# Altium schematic symbol library MCU_Microchip_ATmega.SchLib: 440 symbols (part 2 of 9)
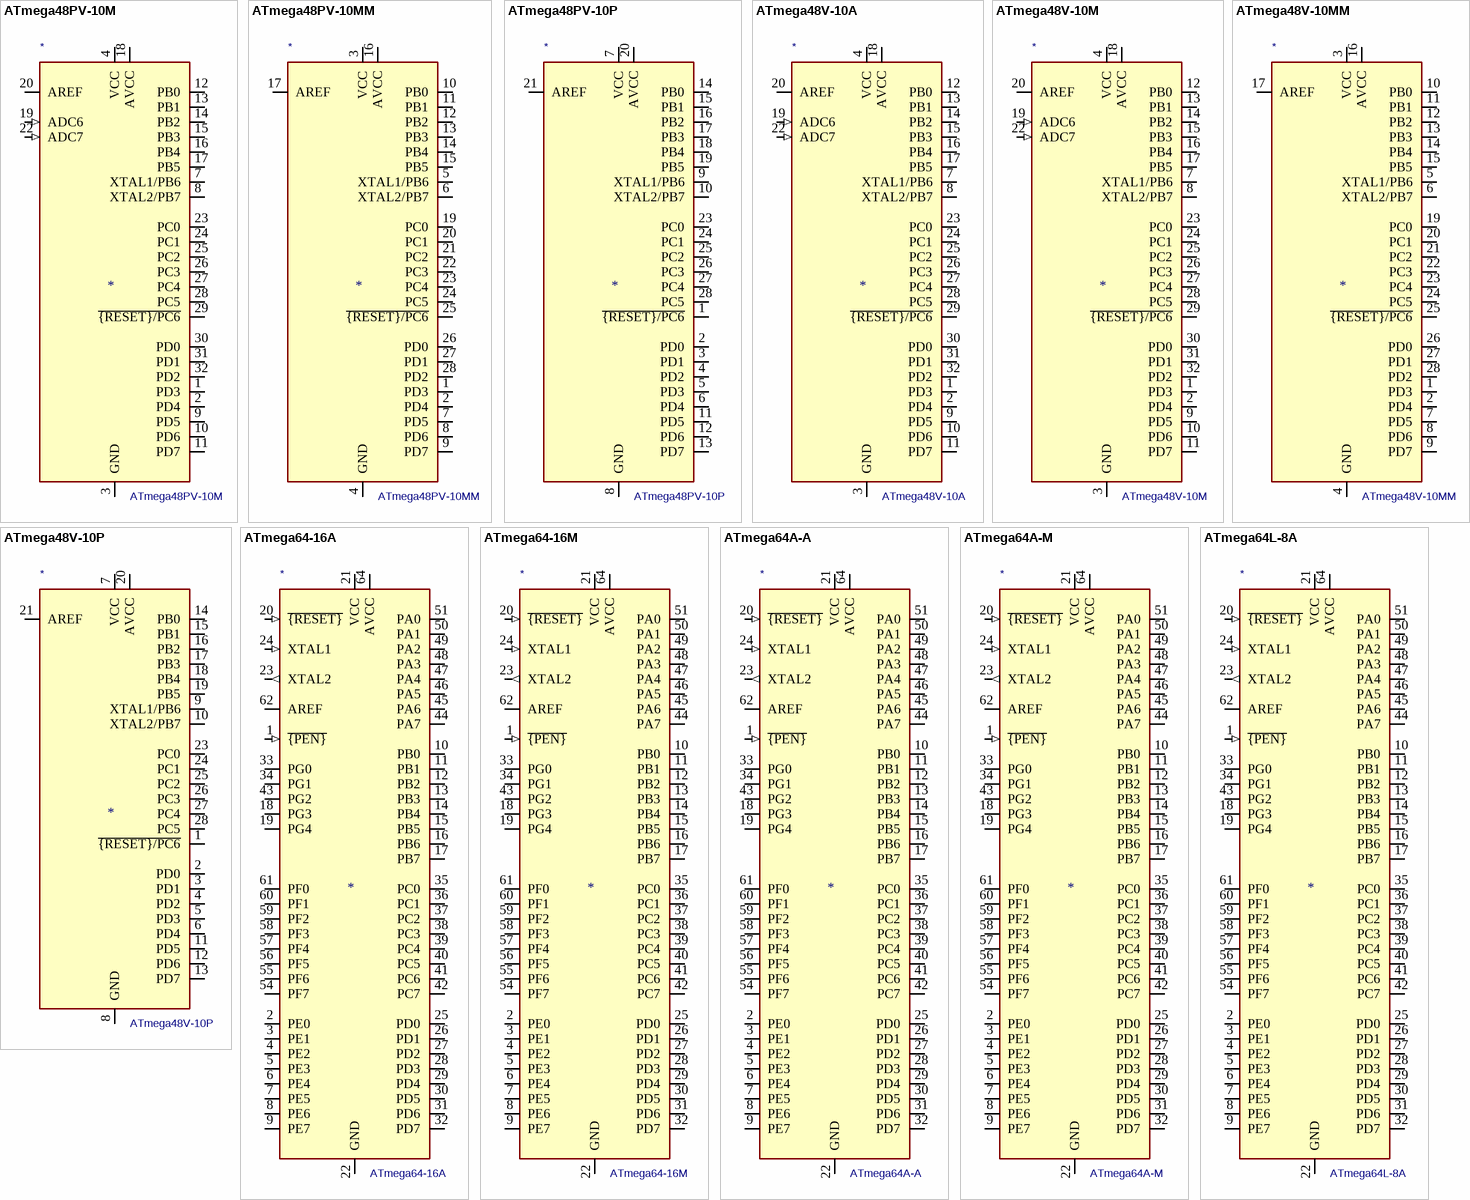
[diagram p41: symbols ATmega48PV-10M to ATmega64L-8A]

## ATmega48PV-10MM
designator *  value ATmega48PV-10MM
ki_keywords: AVR 8bit Microcontroller MegaAVR; ki_description: 10MHz, 4kB Flash, 512B SRAM, 256B EEPROM, QFN-28; ki_fp_filters: QFN*1EP*4x4mm*P0.45mm*; Footprint: Package_DFN_QFN:QFN-28-1EP_4x4mm_P0.45mm_EP2.4x2.4mm; Supplier: http://ww1.microchip.com/downloads/en/DeviceDoc/Atmel-8025-8-bit-AVR-Microcontroller-ATmega48P-88P-168P_Datasheet.pdf
footprint QFN-28-1EP_4x4mm_P0.45mm_EP2.4x2.4mm
pins: 1 PD3 (io), 2 PD4 (io), 3 VCC (power), 4 GND (power), 5 XTAL1/PB6 (io), 6 XTAL2/PB7 (io), 7 PD5 (io), 8 PD6 (io), 9 PD7 (io), 10 PB0 (io), 11 PB1 (io), 12 PB2 (io), 13 PB3 (io), 14 PB4 (io), 15 PB5 (io), 16 AVCC (power), 17 AREF, 18 GND hidden, 19 PC0 (io), 20 PC1 (io), 21 PC2 (io), 22 PC3 (io), 23 PC4 (io), 24 PC5 (io), 25 ~{{RESET}/PC6} (io), 26 PD0 (io), 27 PD1 (io), 28 PD2 (io), 29 GND hidden

## ATmega48PV-10P
designator *  value ATmega48PV-10P
ki_keywords: AVR 8bit Microcontroller MegaAVR; ki_description: 10MHz, 4kB Flash, 512B SRAM, 256B EEPROM, DIP-28; ki_fp_filters: DIP*W7.62mm*; Footprint: Package_DIP:DIP-28_W7.62mm; Supplier: http://ww1.microchip.com/downloads/en/DeviceDoc/Atmel-8025-8-bit-AVR-Microcontroller-ATmega48P-88P-168P_Datasheet.pdf
footprint DIP-28_W7.62mm
pins: 1 ~{{RESET}/PC6} (io), 2 PD0 (io), 3 PD1 (io), 4 PD2 (io), 5 PD3 (io), 6 PD4 (io), 7 VCC (power), 8 GND (power), 9 XTAL1/PB6 (io), 10 XTAL2/PB7 (io), 11 PD5 (io), 12 PD6 (io), 13 PD7 (io), 14 PB0 (io), 15 PB1 (io), 16 PB2 (io), 17 PB3 (io), 18 PB4 (io), 19 PB5 (io), 20 AVCC (power), 21 AREF, 22 GND hidden, 23 PC0 (io), 24 PC1 (io), 25 PC2 (io), 26 PC3 (io), 27 PC4 (io), 28 PC5 (io)

## ATmega48V-10A
designator *  value ATmega48V-10A
ki_keywords: AVR 8bit Microcontroller MegaAVR; ki_description: 10MHz, 4kB Flash, 512B SRAM, 256B EEPROM, TQFP-32; ki_fp_filters: TQFP*7x7mm*P0.8mm*; Footprint: Package_QFP:TQFP-32_7x7mm_P0.8mm; Supplier: http://ww1.microchip.com/downloads/en/DeviceDoc/Atmel-2545-8-bit-AVR-Microcontroller-ATmega48-88-168_Datasheet.pdf
footprint TQFP-32_7x7mm_P0.8mm
pins: 1 PD3 (io), 2 PD4 (io), 3 GND (power), 4 VCC (power), 5 GND hidden, 6 VCC hidden, 7 XTAL1/PB6 (io), 8 XTAL2/PB7 (io), 9 PD5 (io), 10 PD6 (io), 11 PD7 (io), 12 PB0 (io), 13 PB1 (io), 14 PB2 (io), 15 PB3 (io), 16 PB4 (io), 17 PB5 (io), 18 AVCC (power), 19 ADC6 (in), 20 AREF, 21 GND hidden, 22 ADC7 (in), 23 PC0 (io), 24 PC1 (io), 25 PC2 (io), 26 PC3 (io), 27 PC4 (io), 28 PC5 (io), 29 ~{{RESET}/PC6} (io), 30 PD0 (io), 31 PD1 (io), 32 PD2 (io)

## ATmega48V-10M
designator *  value ATmega48V-10M
ki_keywords: AVR 8bit Microcontroller MegaAVR; ki_description: 10MHz, 4kB Flash, 512B SRAM, 256B EEPROM, QFN-32; ki_fp_filters: QFN*1EP*5x5mm*P0.5mm*; Footprint: Package_DFN_QFN:QFN-32-1EP_5x5mm_P0.5mm_EP3.1x3.1mm; Supplier: http://ww1.microchip.com/downloads/en/DeviceDoc/Atmel-2545-8-bit-AVR-Microcontroller-ATmega48-88-168_Datasheet.pdf
footprint QFN-32-1EP_5x5mm_P0.5mm_EP3.1x3.1mm
pins: 1 PD3 (io), 2 PD4 (io), 3 GND (power), 4 VCC (power), 5 GND hidden, 6 VCC hidden, 7 XTAL1/PB6 (io), 8 XTAL2/PB7 (io), 9 PD5 (io), 10 PD6 (io), 11 PD7 (io), 12 PB0 (io), 13 PB1 (io), 14 PB2 (io), 15 PB3 (io), 16 PB4 (io), 17 PB5 (io), 18 AVCC (power), 19 ADC6 (in), 20 AREF, 21 GND hidden, 22 ADC7 (in), 23 PC0 (io), 24 PC1 (io), 25 PC2 (io), 26 PC3 (io), 27 PC4 (io), 28 PC5 (io), 29 ~{{RESET}/PC6} (io), 30 PD0 (io), 31 PD1 (io), 32 PD2 (io), 33 GND hidden

## ATmega48V-10MM
designator *  value ATmega48V-10MM
ki_keywords: AVR 8bit Microcontroller MegaAVR; ki_description: 10MHz, 4kB Flash, 512B SRAM, 256B EEPROM, QFN-28; ki_fp_filters: QFN*1EP*4x4mm*P0.45mm*; Footprint: Package_DFN_QFN:QFN-28-1EP_4x4mm_P0.45mm_EP2.4x2.4mm; Supplier: http://ww1.microchip.com/downloads/en/DeviceDoc/Atmel-2545-8-bit-AVR-Microcontroller-ATmega48-88-168_Datasheet.pdf
footprint QFN-28-1EP_4x4mm_P0.45mm_EP2.4x2.4mm
pins: 1 PD3 (io), 2 PD4 (io), 3 VCC (power), 4 GND (power), 5 XTAL1/PB6 (io), 6 XTAL2/PB7 (io), 7 PD5 (io), 8 PD6 (io), 9 PD7 (io), 10 PB0 (io), 11 PB1 (io), 12 PB2 (io), 13 PB3 (io), 14 PB4 (io), 15 PB5 (io), 16 AVCC (power), 17 AREF, 18 GND hidden, 19 PC0 (io), 20 PC1 (io), 21 PC2 (io), 22 PC3 (io), 23 PC4 (io), 24 PC5 (io), 25 ~{{RESET}/PC6} (io), 26 PD0 (io), 27 PD1 (io), 28 PD2 (io), 29 GND hidden

## ATmega48V-10P
designator *  value ATmega48V-10P
ki_keywords: AVR 8bit Microcontroller MegaAVR; ki_description: 10MHz, 4kB Flash, 512B SRAM, 256B EEPROM, DIP-28; ki_fp_filters: DIP*W7.62mm*; Footprint: Package_DIP:DIP-28_W7.62mm; Supplier: http://ww1.microchip.com/downloads/en/DeviceDoc/Atmel-2545-8-bit-AVR-Microcontroller-ATmega48-88-168_Datasheet.pdf
footprint DIP-28_W7.62mm
pins: 1 ~{{RESET}/PC6} (io), 2 PD0 (io), 3 PD1 (io), 4 PD2 (io), 5 PD3 (io), 6 PD4 (io), 7 VCC (power), 8 GND (power), 9 XTAL1/PB6 (io), 10 XTAL2/PB7 (io), 11 PD5 (io), 12 PD6 (io), 13 PD7 (io), 14 PB0 (io), 15 PB1 (io), 16 PB2 (io), 17 PB3 (io), 18 PB4 (io), 19 PB5 (io), 20 AVCC (power), 21 AREF, 22 GND hidden, 23 PC0 (io), 24 PC1 (io), 25 PC2 (io), 26 PC3 (io), 27 PC4 (io), 28 PC5 (io)

## ATmega64-16A
designator *  value ATmega64-16A
ki_keywords: AVR 8bit Microcontroller MegaAVR; ki_description: 16MHz, 64kB Flash, 4kB SRAM, 2kB EEPROM, TQFP-64; ki_fp_filters: TQFP*14x14mm*P0.8mm*; Footprint: Package_QFP:TQFP-64_14x14mm_P0.8mm; Supplier: http://ww1.microchip.com/downloads/en/DeviceDoc/atmel-2490-8-bit-avr-microcontroller-atmega64-l_datasheet.pdf
footprint TQFP-64_14x14mm_P0.8mm
pins: 1 ~{{PEN}} (in), 2 PE0 (io), 3 PE1 (io), 4 PE2 (io), 5 PE3 (io), 6 PE4 (io), 7 PE5 (io), 8 PE6 (io), 9 PE7 (io), 10 PB0 (io), 11 PB1 (io), 12 PB2 (io), 13 PB3 (io), 14 PB4 (io), 15 PB5 (io), 16 PB6 (io), 17 PB7 (io), 18 PG3 (io), 19 PG4 (io), 20 ~{{RESET}} (in), 21 VCC (power), 22 GND (power), 23 XTAL2 (out), 24 XTAL1 (in), 25 PD0 (io), 26 PD1 (io), 27 PD2 (io), 28 PD3 (io), 29 PD4 (io), 30 PD5 (io), 31 PD6 (io), 32 PD7 (io), 33 PG0 (io), 34 PG1 (io), 35 PC0 (io), 36 PC1 (io), 37 PC2 (io), 38 PC3 (io), 39 PC4 (io), 40 PC5 (io), 41 PC6 (io), 42 PC7 (io), 43 PG2 (io), 44 PA7 (io), 45 PA6 (io), 46 PA5 (io), 47 PA4 (io), 48 PA3 (io), 49 PA2 (io), 50 PA1 (io), 51 PA0 (io), 52 VCC hidden, 53 GND hidden, 54 PF7 (io), 55 PF6 (io), 56 PF5 (io), 57 PF4 (io), 58 PF3 (io), 59 PF2 (io), 60 PF1 (io), 61 PF0 (io), 62 AREF, 63 GND hidden, 64 AVCC (power)

## ATmega64-16M
designator *  value ATmega64-16M
ki_keywords: AVR 8bit Microcontroller MegaAVR; ki_description: 16MHz, 64kB Flash, 4kB SRAM, 2kB EEPROM, QFN-64; ki_fp_filters: QFN*1EP*9x9mm*P0.5mm*; Footprint: Package_DFN_QFN:QFN-64-1EP_9x9mm_P0.5mm_EP5.4x5.4mm; Supplier: http://ww1.microchip.com/downloads/en/DeviceDoc/atmel-2490-8-bit-avr-microcontroller-atmega64-l_datasheet.pdf
footprint QFN-64-1EP_9x9mm_P0.5mm_EP5.4x5.4mm
pins: 1 ~{{PEN}} (in), 2 PE0 (io), 3 PE1 (io), 4 PE2 (io), 5 PE3 (io), 6 PE4 (io), 7 PE5 (io), 8 PE6 (io), 9 PE7 (io), 10 PB0 (io), 11 PB1 (io), 12 PB2 (io), 13 PB3 (io), 14 PB4 (io), 15 PB5 (io), 16 PB6 (io), 17 PB7 (io), 18 PG3 (io), 19 PG4 (io), 20 ~{{RESET}} (in), 21 VCC (power), 22 GND (power), 23 XTAL2 (out), 24 XTAL1 (in), 25 PD0 (io), 26 PD1 (io), 27 PD2 (io), 28 PD3 (io), 29 PD4 (io), 30 PD5 (io), 31 PD6 (io), 32 PD7 (io), 33 PG0 (io), 34 PG1 (io), 35 PC0 (io), 36 PC1 (io), 37 PC2 (io), 38 PC3 (io), 39 PC4 (io), 40 PC5 (io), 41 PC6 (io), 42 PC7 (io), 43 PG2 (io), 44 PA7 (io), 45 PA6 (io), 46 PA5 (io), 47 PA4 (io), 48 PA3 (io), 49 PA2 (io), 50 PA1 (io), 51 PA0 (io), 52 VCC hidden, 53 GND hidden, 54 PF7 (io), 55 PF6 (io), 56 PF5 (io), 57 PF4 (io), 58 PF3 (io), 59 PF2 (io), 60 PF1 (io), 61 PF0 (io), 62 AREF, 63 GND hidden, 64 AVCC (power), 65 GND hidden

## ATmega64A-A
designator *  value ATmega64A-A
ki_keywords: AVR 8bit Microcontroller MegaAVR; ki_description: 16MHz, 64kB Flash, 4kB SRAM, 2kB EEPROM, TQFP-64; ki_fp_filters: TQFP*14x14mm*P0.8mm*; Footprint: Package_QFP:TQFP-64_14x14mm_P0.8mm; Supplier: http://ww1.microchip.com/downloads/en/DeviceDoc/atmel-8160-8-bit-avr-microcontroller-atmega64a-datasheet.pdf
footprint TQFP-64_14x14mm_P0.8mm
pins: 1 ~{{PEN}} (in), 2 PE0 (io), 3 PE1 (io), 4 PE2 (io), 5 PE3 (io), 6 PE4 (io), 7 PE5 (io), 8 PE6 (io), 9 PE7 (io), 10 PB0 (io), 11 PB1 (io), 12 PB2 (io), 13 PB3 (io), 14 PB4 (io), 15 PB5 (io), 16 PB6 (io), 17 PB7 (io), 18 PG3 (io), 19 PG4 (io), 20 ~{{RESET}} (in), 21 VCC (power), 22 GND (power), 23 XTAL2 (out), 24 XTAL1 (in), 25 PD0 (io), 26 PD1 (io), 27 PD2 (io), 28 PD3 (io), 29 PD4 (io), 30 PD5 (io), 31 PD6 (io), 32 PD7 (io), 33 PG0 (io), 34 PG1 (io), 35 PC0 (io), 36 PC1 (io), 37 PC2 (io), 38 PC3 (io), 39 PC4 (io), 40 PC5 (io), 41 PC6 (io), 42 PC7 (io), 43 PG2 (io), 44 PA7 (io), 45 PA6 (io), 46 PA5 (io), 47 PA4 (io), 48 PA3 (io), 49 PA2 (io), 50 PA1 (io), 51 PA0 (io), 52 VCC hidden, 53 GND hidden, 54 PF7 (io), 55 PF6 (io), 56 PF5 (io), 57 PF4 (io), 58 PF3 (io), 59 PF2 (io), 60 PF1 (io), 61 PF0 (io), 62 AREF, 63 GND hidden, 64 AVCC (power)

## ATmega64A-M
designator *  value ATmega64A-M
ki_keywords: AVR 8bit Microcontroller MegaAVR; ki_description: 16MHz, 64kB Flash, 4kB SRAM, 2kB EEPROM, QFN-64; ki_fp_filters: QFN*1EP*9x9mm*P0.5mm*; Footprint: Package_DFN_QFN:QFN-64-1EP_9x9mm_P0.5mm_EP5.4x5.4mm; Supplier: http://ww1.microchip.com/downloads/en/DeviceDoc/atmel-8160-8-bit-avr-microcontroller-atmega64a-datasheet.pdf
footprint QFN-64-1EP_9x9mm_P0.5mm_EP5.4x5.4mm
pins: 1 ~{{PEN}} (in), 2 PE0 (io), 3 PE1 (io), 4 PE2 (io), 5 PE3 (io), 6 PE4 (io), 7 PE5 (io), 8 PE6 (io), 9 PE7 (io), 10 PB0 (io), 11 PB1 (io), 12 PB2 (io), 13 PB3 (io), 14 PB4 (io), 15 PB5 (io), 16 PB6 (io), 17 PB7 (io), 18 PG3 (io), 19 PG4 (io), 20 ~{{RESET}} (in), 21 VCC (power), 22 GND (power), 23 XTAL2 (out), 24 XTAL1 (in), 25 PD0 (io), 26 PD1 (io), 27 PD2 (io), 28 PD3 (io), 29 PD4 (io), 30 PD5 (io), 31 PD6 (io), 32 PD7 (io), 33 PG0 (io), 34 PG1 (io), 35 PC0 (io), 36 PC1 (io), 37 PC2 (io), 38 PC3 (io), 39 PC4 (io), 40 PC5 (io), 41 PC6 (io), 42 PC7 (io), 43 PG2 (io), 44 PA7 (io), 45 PA6 (io), 46 PA5 (io), 47 PA4 (io), 48 PA3 (io), 49 PA2 (io), 50 PA1 (io), 51 PA0 (io), 52 VCC hidden, 53 GND hidden, 54 PF7 (io), 55 PF6 (io), 56 PF5 (io), 57 PF4 (io), 58 PF3 (io), 59 PF2 (io), 60 PF1 (io), 61 PF0 (io), 62 AREF, 63 GND hidden, 64 AVCC (power), 65 GND hidden

## ATmega64L-8A
designator *  value ATmega64L-8A
ki_keywords: AVR 8bit Microcontroller MegaAVR; ki_description: 8MHz, 64kB Flash, 4kB SRAM, 2kB EEPROM, TQFP-64; ki_fp_filters: TQFP*14x14mm*P0.8mm*; Footprint: Package_QFP:TQFP-64_14x14mm_P0.8mm; Supplier: http://ww1.microchip.com/downloads/en/DeviceDoc/atmel-2490-8-bit-avr-microcontroller-atmega64-l_datasheet.pdf
footprint TQFP-64_14x14mm_P0.8mm
pins: 1 ~{{PEN}} (in), 2 PE0 (io), 3 PE1 (io), 4 PE2 (io), 5 PE3 (io), 6 PE4 (io), 7 PE5 (io), 8 PE6 (io), 9 PE7 (io), 10 PB0 (io), 11 PB1 (io), 12 PB2 (io), 13 PB3 (io), 14 PB4 (io), 15 PB5 (io), 16 PB6 (io), 17 PB7 (io), 18 PG3 (io), 19 PG4 (io), 20 ~{{RESET}} (in), 21 VCC (power), 22 GND (power), 23 XTAL2 (out), 24 XTAL1 (in), 25 PD0 (io), 26 PD1 (io), 27 PD2 (io), 28 PD3 (io), 29 PD4 (io), 30 PD5 (io), 31 PD6 (io), 32 PD7 (io), 33 PG0 (io), 34 PG1 (io), 35 PC0 (io), 36 PC1 (io), 37 PC2 (io), 38 PC3 (io), 39 PC4 (io), 40 PC5 (io), 41 PC6 (io), 42 PC7 (io), 43 PG2 (io), 44 PA7 (io), 45 PA6 (io), 46 PA5 (io), 47 PA4 (io), 48 PA3 (io), 49 PA2 (io), 50 PA1 (io), 51 PA0 (io), 52 VCC hidden, 53 GND hidden, 54 PF7 (io), 55 PF6 (io), 56 PF5 (io), 57 PF4 (io), 58 PF3 (io), 59 PF2 (io), 60 PF1 (io), 61 PF0 (io), 62 AREF, 63 GND hidden, 64 AVCC (power)

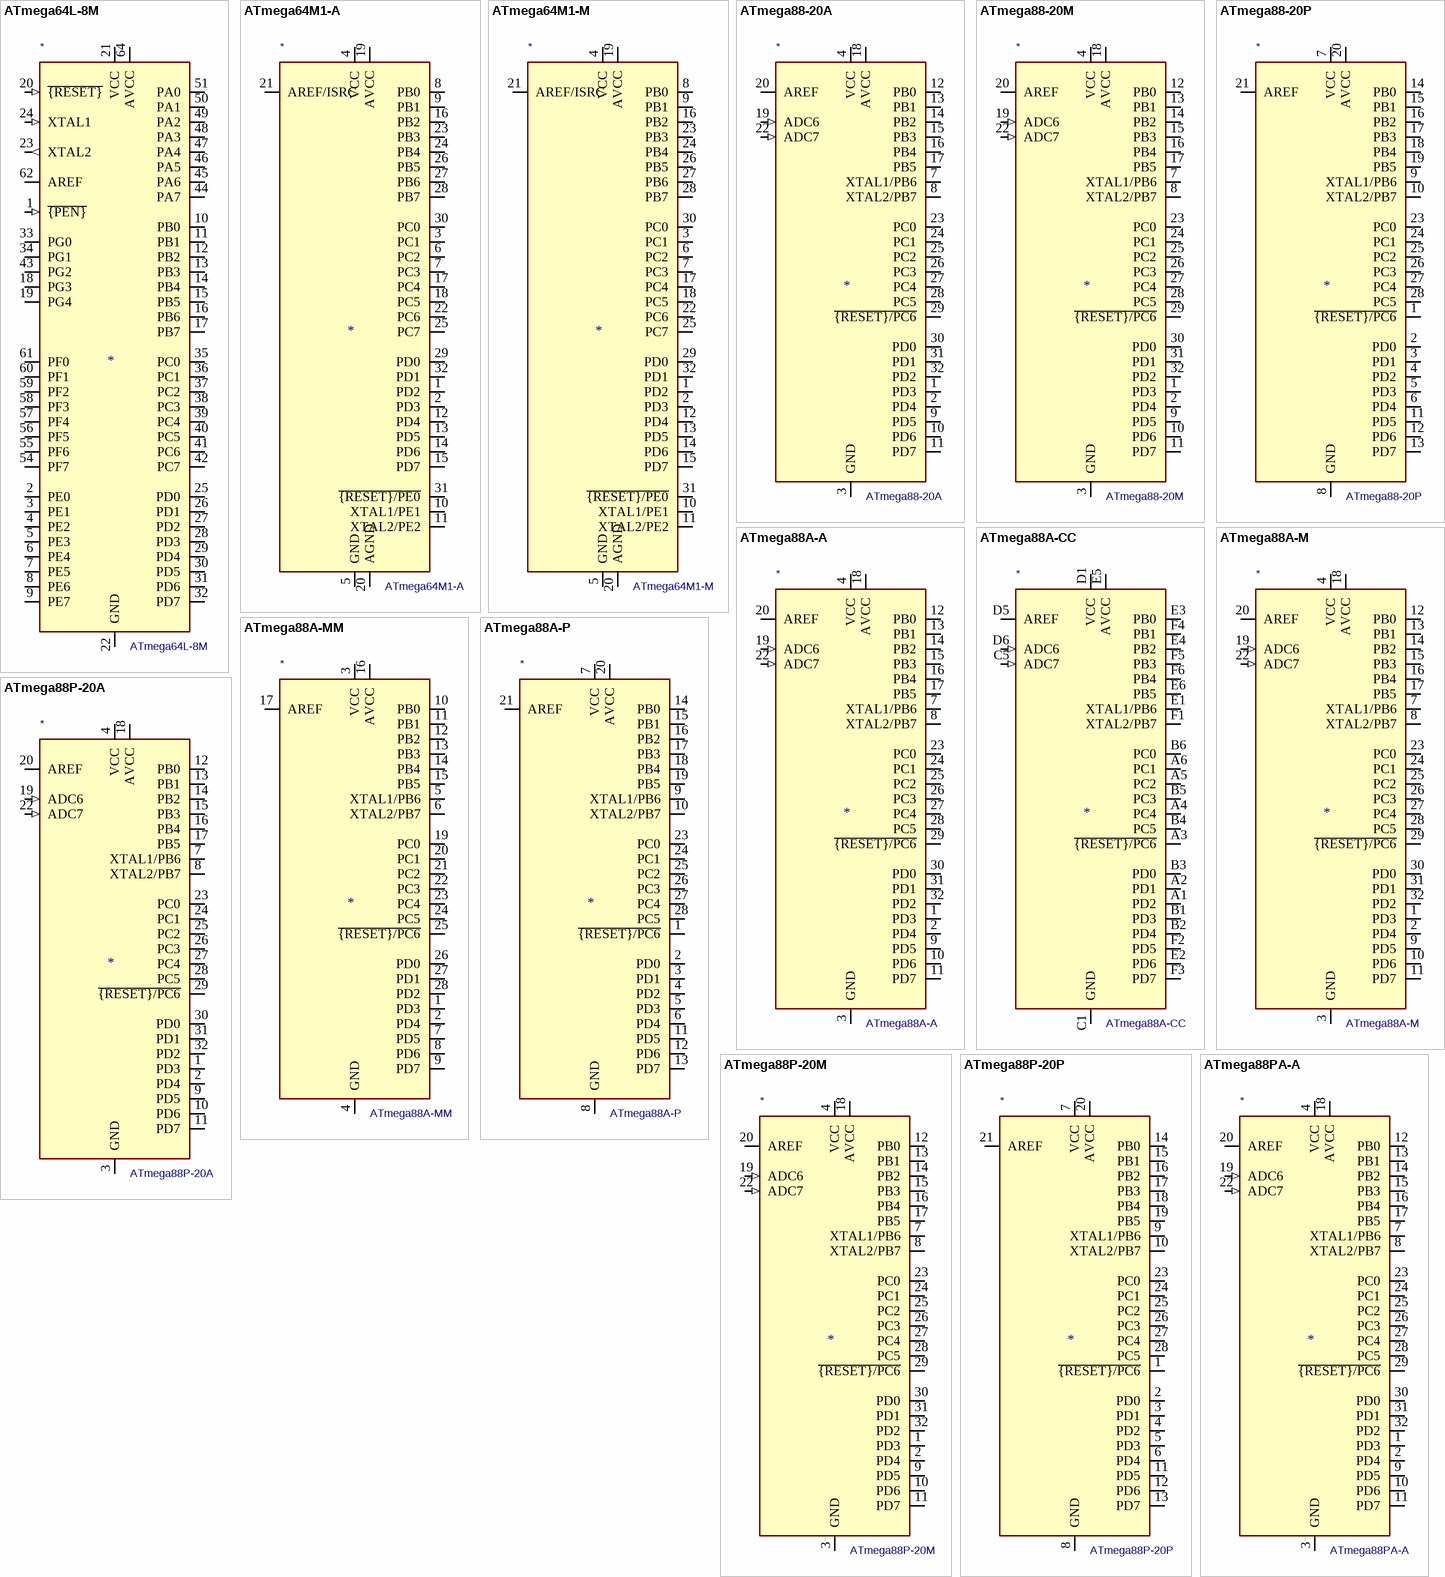
[diagram p6: symbols ATmega64L-8M to ATmega88PA-A]

## ATmega64L-8M
designator *  value ATmega64L-8M
ki_keywords: AVR 8bit Microcontroller MegaAVR; ki_description: 8MHz, 64kB Flash, 4kB SRAM, 2kB EEPROM, QFN-64; ki_fp_filters: QFN*1EP*9x9mm*P0.5mm*; Footprint: Package_DFN_QFN:QFN-64-1EP_9x9mm_P0.5mm_EP5.4x5.4mm; Supplier: http://ww1.microchip.com/downloads/en/DeviceDoc/atmel-2490-8-bit-avr-microcontroller-atmega64-l_datasheet.pdf
footprint QFN-64-1EP_9x9mm_P0.5mm_EP5.4x5.4mm
pins: 1 ~{{PEN}} (in), 2 PE0 (io), 3 PE1 (io), 4 PE2 (io), 5 PE3 (io), 6 PE4 (io), 7 PE5 (io), 8 PE6 (io), 9 PE7 (io), 10 PB0 (io), 11 PB1 (io), 12 PB2 (io), 13 PB3 (io), 14 PB4 (io), 15 PB5 (io), 16 PB6 (io), 17 PB7 (io), 18 PG3 (io), 19 PG4 (io), 20 ~{{RESET}} (in), 21 VCC (power), 22 GND (power), 23 XTAL2 (out), 24 XTAL1 (in), 25 PD0 (io), 26 PD1 (io), 27 PD2 (io), 28 PD3 (io), 29 PD4 (io), 30 PD5 (io), 31 PD6 (io), 32 PD7 (io), 33 PG0 (io), 34 PG1 (io), 35 PC0 (io), 36 PC1 (io), 37 PC2 (io), 38 PC3 (io), 39 PC4 (io), 40 PC5 (io), 41 PC6 (io), 42 PC7 (io), 43 PG2 (io), 44 PA7 (io), 45 PA6 (io), 46 PA5 (io), 47 PA4 (io), 48 PA3 (io), 49 PA2 (io), 50 PA1 (io), 51 PA0 (io), 52 VCC hidden, 53 GND hidden, 54 PF7 (io), 55 PF6 (io), 56 PF5 (io), 57 PF4 (io), 58 PF3 (io), 59 PF2 (io), 60 PF1 (io), 61 PF0 (io), 62 AREF, 63 GND hidden, 64 AVCC (power), 65 GND hidden

## ATmega64M1-A
designator *  value ATmega64M1-A
ki_keywords: AVR 8bit Microcontroller MegaAVR; ki_description: 16MHz, 64kB Flash, 4kB SRAM, 2kB EEPROM, CAN, TQFP-32; ki_fp_filters: TQFP*7x7mm*P0.8mm*; Footprint: Package_QFP:TQFP-32_7x7mm_P0.8mm; Supplier: http://ww1.microchip.com/downloads/en/DeviceDoc/Atmel-8209-8-bit%20AVR%20ATmega16M1-32M1-64M1_Datasheet.pdf
footprint TQFP-32_7x7mm_P0.8mm
pins: 1 PD2 (io), 2 PD3 (io), 3 PC1 (io), 4 VCC (power), 5 GND (power), 6 PC2 (io), 7 PC3 (io), 8 PB0 (io), 9 PB1 (io), 10 XTAL1/PE1 (io), 11 XTAL2/PE2 (io), 12 PD4 (io), 13 PD5 (io), 14 PD6 (io), 15 PD7 (io), 16 PB2 (io), 17 PC4 (io), 18 PC5 (io), 19 AVCC (power), 20 AGND (power), 21 AREF/ISRC, 22 PC6 (io), 23 PB3 (io), 24 PB4 (io), 25 PC7 (io), 26 PB5 (io), 27 PB6 (io), 28 PB7 (io), 29 PD0 (io), 30 PC0 (io), 31 ~{{RESET}/PE0} (io), 32 PD1 (io)

## ATmega64M1-M
designator *  value ATmega64M1-M
ki_keywords: AVR 8bit Microcontroller MegaAVR; ki_description: 16MHz, 64kB Flash, 4kB SRAM, 2kB EEPROM, CAN, QFN-32; ki_fp_filters: QFN*1EP*7x7mm*P0.65mm*; Footprint: Package_DFN_QFN:QFN-32-1EP_7x7mm_P0.65mm_EP4.65x4.65mm; Supplier: http://ww1.microchip.com/downloads/en/DeviceDoc/Atmel-8209-8-bit%20AVR%20ATmega16M1-32M1-64M1_Datasheet.pdf
footprint QFN-32-1EP_7x7mm_P0.65mm_EP4.65x4.65mm
pins: 1 PD2 (io), 2 PD3 (io), 3 PC1 (io), 4 VCC (power), 5 GND (power), 6 PC2 (io), 7 PC3 (io), 8 PB0 (io), 9 PB1 (io), 10 XTAL1/PE1 (io), 11 XTAL2/PE2 (io), 12 PD4 (io), 13 PD5 (io), 14 PD6 (io), 15 PD7 (io), 16 PB2 (io), 17 PC4 (io), 18 PC5 (io), 19 AVCC (power), 20 AGND (power), 21 AREF/ISRC, 22 PC6 (io), 23 PB3 (io), 24 PB4 (io), 25 PC7 (io), 26 PB5 (io), 27 PB6 (io), 28 PB7 (io), 29 PD0 (io), 30 PC0 (io), 31 ~{{RESET}/PE0} (io), 32 PD1 (io), 33 GND hidden

## ATmega88-20A
designator *  value ATmega88-20A
ki_keywords: AVR 8bit Microcontroller MegaAVR; ki_description: 20MHz, 8kB Flash, 1kB SRAM, 512B EEPROM, TQFP-32; ki_fp_filters: TQFP*7x7mm*P0.8mm*; Footprint: Package_QFP:TQFP-32_7x7mm_P0.8mm; Supplier: http://ww1.microchip.com/downloads/en/DeviceDoc/Atmel-2545-8-bit-AVR-Microcontroller-ATmega48-88-168_Datasheet.pdf
footprint TQFP-32_7x7mm_P0.8mm
pins: 1 PD3 (io), 2 PD4 (io), 3 GND (power), 4 VCC (power), 5 GND hidden, 6 VCC hidden, 7 XTAL1/PB6 (io), 8 XTAL2/PB7 (io), 9 PD5 (io), 10 PD6 (io), 11 PD7 (io), 12 PB0 (io), 13 PB1 (io), 14 PB2 (io), 15 PB3 (io), 16 PB4 (io), 17 PB5 (io), 18 AVCC (power), 19 ADC6 (in), 20 AREF, 21 GND hidden, 22 ADC7 (in), 23 PC0 (io), 24 PC1 (io), 25 PC2 (io), 26 PC3 (io), 27 PC4 (io), 28 PC5 (io), 29 ~{{RESET}/PC6} (io), 30 PD0 (io), 31 PD1 (io), 32 PD2 (io)

## ATmega88-20M
designator *  value ATmega88-20M
ki_keywords: AVR 8bit Microcontroller MegaAVR; ki_description: 20MHz, 8kB Flash, 1kB SRAM, 512B EEPROM, QFN-32; ki_fp_filters: QFN*1EP*5x5mm*P0.5mm*; Footprint: Package_DFN_QFN:QFN-32-1EP_5x5mm_P0.5mm_EP3.1x3.1mm; Supplier: http://ww1.microchip.com/downloads/en/DeviceDoc/Atmel-2545-8-bit-AVR-Microcontroller-ATmega48-88-168_Datasheet.pdf
footprint QFN-32-1EP_5x5mm_P0.5mm_EP3.1x3.1mm
pins: 1 PD3 (io), 2 PD4 (io), 3 GND (power), 4 VCC (power), 5 GND hidden, 6 VCC hidden, 7 XTAL1/PB6 (io), 8 XTAL2/PB7 (io), 9 PD5 (io), 10 PD6 (io), 11 PD7 (io), 12 PB0 (io), 13 PB1 (io), 14 PB2 (io), 15 PB3 (io), 16 PB4 (io), 17 PB5 (io), 18 AVCC (power), 19 ADC6 (in), 20 AREF, 21 GND hidden, 22 ADC7 (in), 23 PC0 (io), 24 PC1 (io), 25 PC2 (io), 26 PC3 (io), 27 PC4 (io), 28 PC5 (io), 29 ~{{RESET}/PC6} (io), 30 PD0 (io), 31 PD1 (io), 32 PD2 (io), 33 GND hidden

## ATmega88-20P
designator *  value ATmega88-20P
ki_keywords: AVR 8bit Microcontroller MegaAVR; ki_description: 20MHz, 8kB Flash, 1kB SRAM, 512B EEPROM, DIP-28; ki_fp_filters: DIP*W7.62mm*; Footprint: Package_DIP:DIP-28_W7.62mm; Supplier: http://ww1.microchip.com/downloads/en/DeviceDoc/Atmel-2545-8-bit-AVR-Microcontroller-ATmega48-88-168_Datasheet.pdf
footprint DIP-28_W7.62mm
pins: 1 ~{{RESET}/PC6} (io), 2 PD0 (io), 3 PD1 (io), 4 PD2 (io), 5 PD3 (io), 6 PD4 (io), 7 VCC (power), 8 GND (power), 9 XTAL1/PB6 (io), 10 XTAL2/PB7 (io), 11 PD5 (io), 12 PD6 (io), 13 PD7 (io), 14 PB0 (io), 15 PB1 (io), 16 PB2 (io), 17 PB3 (io), 18 PB4 (io), 19 PB5 (io), 20 AVCC (power), 21 AREF, 22 GND hidden, 23 PC0 (io), 24 PC1 (io), 25 PC2 (io), 26 PC3 (io), 27 PC4 (io), 28 PC5 (io)

## ATmega88A-A
designator *  value ATmega88A-A
ki_keywords: AVR 8bit Microcontroller MegaAVR; ki_description: 20MHz, 8kB Flash, 1kB SRAM, 512B EEPROM, TQFP-32; ki_fp_filters: TQFP*7x7mm*P0.8mm*; Footprint: Package_QFP:TQFP-32_7x7mm_P0.8mm; Supplier: http://ww1.microchip.com/downloads/en/DeviceDoc/ATmega48A_88A_168A-Data-Sheet-40002007A.pdf
footprint TQFP-32_7x7mm_P0.8mm
pins: 1 PD3 (io), 2 PD4 (io), 3 GND (power), 4 VCC (power), 5 GND hidden, 6 VCC hidden, 7 XTAL1/PB6 (io), 8 XTAL2/PB7 (io), 9 PD5 (io), 10 PD6 (io), 11 PD7 (io), 12 PB0 (io), 13 PB1 (io), 14 PB2 (io), 15 PB3 (io), 16 PB4 (io), 17 PB5 (io), 18 AVCC (power), 19 ADC6 (in), 20 AREF, 21 GND hidden, 22 ADC7 (in), 23 PC0 (io), 24 PC1 (io), 25 PC2 (io), 26 PC3 (io), 27 PC4 (io), 28 PC5 (io), 29 ~{{RESET}/PC6} (io), 30 PD0 (io), 31 PD1 (io), 32 PD2 (io)

## ATmega88A-CC
designator *  value ATmega88A-CC
ki_keywords: AVR 8bit Microcontroller MegaAVR; ki_description: 20MHz, 8kB Flash, 1kB SRAM, 512B EEPROM, UFBGA-32; ki_fp_filters: UFBGA*4.0x4.0mm*Layout6x6*P0.5mm*; Footprint: Package_BGA:UFBGA-32_4.0x4.0mm_Layout6x6_P0.5mm; Supplier: http://ww1.microchip.com/downloads/en/DeviceDoc/ATmega48A_88A_168A-Data-Sheet-40002007A.pdf
footprint UFBGA-32_4.0x4.0mm_Layout6x6_P0.5mm
pins: A1 PD2 (io), A2 PD1 (io), A3 ~{{RESET}/PC6} (io), A4 PC4 (io), A5 PC2 (io), A6 PC1 (io), B1 PD3 (io), B2 PD4 (io), B3 PD0 (io), B4 PC5 (io), B5 PC3 (io), B6 PC0 (io), C1 GND (power), C2 GND hidden, C5 ADC7 (in), C6 GND hidden, D1 VCC (power), D2 VCC hidden, D5 AREF, D6 ADC6 (in), E1 XTAL1/PB6 (io), E2 PD6 (io), E3 PB0 (io), E4 PB2 (io), E5 AVCC (power), E6 PB5 (io), F1 XTAL2/PB7 (io), F2 PD5 (io), F3 PD7 (io), F4 PB1 (io), F5 PB3 (io), F6 PB4 (io)

## ATmega88A-M
designator *  value ATmega88A-M
ki_keywords: AVR 8bit Microcontroller MegaAVR; ki_description: 20MHz, 8kB Flash, 1kB SRAM, 512B EEPROM, QFN-32; ki_fp_filters: QFN*1EP*5x5mm*P0.5mm*; Footprint: Package_DFN_QFN:QFN-32-1EP_5x5mm_P0.5mm_EP3.1x3.1mm; Supplier: http://ww1.microchip.com/downloads/en/DeviceDoc/ATmega48A_88A_168A-Data-Sheet-40002007A.pdf
footprint QFN-32-1EP_5x5mm_P0.5mm_EP3.1x3.1mm
pins: 1 PD3 (io), 2 PD4 (io), 3 GND (power), 4 VCC (power), 5 GND hidden, 6 VCC hidden, 7 XTAL1/PB6 (io), 8 XTAL2/PB7 (io), 9 PD5 (io), 10 PD6 (io), 11 PD7 (io), 12 PB0 (io), 13 PB1 (io), 14 PB2 (io), 15 PB3 (io), 16 PB4 (io), 17 PB5 (io), 18 AVCC (power), 19 ADC6 (in), 20 AREF, 21 GND hidden, 22 ADC7 (in), 23 PC0 (io), 24 PC1 (io), 25 PC2 (io), 26 PC3 (io), 27 PC4 (io), 28 PC5 (io), 29 ~{{RESET}/PC6} (io), 30 PD0 (io), 31 PD1 (io), 32 PD2 (io), 33 GND hidden

## ATmega88A-MM
designator *  value ATmega88A-MM
ki_keywords: AVR 8bit Microcontroller MegaAVR; ki_description: 20MHz, 8kB Flash, 1kB SRAM, 512B EEPROM, QFN-28; ki_fp_filters: QFN*1EP*4x4mm*P0.45mm*; Footprint: Package_DFN_QFN:QFN-28-1EP_4x4mm_P0.45mm_EP2.4x2.4mm; Supplier: http://ww1.microchip.com/downloads/en/DeviceDoc/ATmega48A_88A_168A-Data-Sheet-40002007A.pdf
footprint QFN-28-1EP_4x4mm_P0.45mm_EP2.4x2.4mm
pins: 1 PD3 (io), 2 PD4 (io), 3 VCC (power), 4 GND (power), 5 XTAL1/PB6 (io), 6 XTAL2/PB7 (io), 7 PD5 (io), 8 PD6 (io), 9 PD7 (io), 10 PB0 (io), 11 PB1 (io), 12 PB2 (io), 13 PB3 (io), 14 PB4 (io), 15 PB5 (io), 16 AVCC (power), 17 AREF, 18 GND hidden, 19 PC0 (io), 20 PC1 (io), 21 PC2 (io), 22 PC3 (io), 23 PC4 (io), 24 PC5 (io), 25 ~{{RESET}/PC6} (io), 26 PD0 (io), 27 PD1 (io), 28 PD2 (io), 29 GND hidden

## ATmega88A-P
designator *  value ATmega88A-P
ki_keywords: AVR 8bit Microcontroller MegaAVR; ki_description: 20MHz, 8kB Flash, 1kB SRAM, 512B EEPROM, DIP-28; ki_fp_filters: DIP*W7.62mm*; Footprint: Package_DIP:DIP-28_W7.62mm; Supplier: http://ww1.microchip.com/downloads/en/DeviceDoc/ATmega48A_88A_168A-Data-Sheet-40002007A.pdf
footprint DIP-28_W7.62mm
pins: 1 ~{{RESET}/PC6} (io), 2 PD0 (io), 3 PD1 (io), 4 PD2 (io), 5 PD3 (io), 6 PD4 (io), 7 VCC (power), 8 GND (power), 9 XTAL1/PB6 (io), 10 XTAL2/PB7 (io), 11 PD5 (io), 12 PD6 (io), 13 PD7 (io), 14 PB0 (io), 15 PB1 (io), 16 PB2 (io), 17 PB3 (io), 18 PB4 (io), 19 PB5 (io), 20 AVCC (power), 21 AREF, 22 GND hidden, 23 PC0 (io), 24 PC1 (io), 25 PC2 (io), 26 PC3 (io), 27 PC4 (io), 28 PC5 (io)

## ATmega88P-20A
designator *  value ATmega88P-20A
ki_keywords: AVR 8bit Microcontroller MegaAVR; ki_description: 20MHz, 8kB Flash, 1kB SRAM, 512B EEPROM, TQFP-32; ki_fp_filters: TQFP*7x7mm*P0.8mm*; Footprint: Package_QFP:TQFP-32_7x7mm_P0.8mm; Supplier: http://ww1.microchip.com/downloads/en/DeviceDoc/Atmel-8025-8-bit-AVR-Microcontroller-ATmega48P-88P-168P_Datasheet.pdf
footprint TQFP-32_7x7mm_P0.8mm
pins: 1 PD3 (io), 2 PD4 (io), 3 GND (power), 4 VCC (power), 5 GND hidden, 6 VCC hidden, 7 XTAL1/PB6 (io), 8 XTAL2/PB7 (io), 9 PD5 (io), 10 PD6 (io), 11 PD7 (io), 12 PB0 (io), 13 PB1 (io), 14 PB2 (io), 15 PB3 (io), 16 PB4 (io), 17 PB5 (io), 18 AVCC (power), 19 ADC6 (in), 20 AREF, 21 GND hidden, 22 ADC7 (in), 23 PC0 (io), 24 PC1 (io), 25 PC2 (io), 26 PC3 (io), 27 PC4 (io), 28 PC5 (io), 29 ~{{RESET}/PC6} (io), 30 PD0 (io), 31 PD1 (io), 32 PD2 (io)

## ATmega88P-20M
designator *  value ATmega88P-20M
ki_keywords: AVR 8bit Microcontroller MegaAVR; ki_description: 20MHz, 8kB Flash, 1kB SRAM, 512B EEPROM, QFN-32; ki_fp_filters: QFN*1EP*5x5mm*P0.5mm*; Footprint: Package_DFN_QFN:QFN-32-1EP_5x5mm_P0.5mm_EP3.1x3.1mm; Supplier: http://ww1.microchip.com/downloads/en/DeviceDoc/Atmel-8025-8-bit-AVR-Microcontroller-ATmega48P-88P-168P_Datasheet.pdf
footprint QFN-32-1EP_5x5mm_P0.5mm_EP3.1x3.1mm
pins: 1 PD3 (io), 2 PD4 (io), 3 GND (power), 4 VCC (power), 5 GND hidden, 6 VCC hidden, 7 XTAL1/PB6 (io), 8 XTAL2/PB7 (io), 9 PD5 (io), 10 PD6 (io), 11 PD7 (io), 12 PB0 (io), 13 PB1 (io), 14 PB2 (io), 15 PB3 (io), 16 PB4 (io), 17 PB5 (io), 18 AVCC (power), 19 ADC6 (in), 20 AREF, 21 GND hidden, 22 ADC7 (in), 23 PC0 (io), 24 PC1 (io), 25 PC2 (io), 26 PC3 (io), 27 PC4 (io), 28 PC5 (io), 29 ~{{RESET}/PC6} (io), 30 PD0 (io), 31 PD1 (io), 32 PD2 (io), 33 GND hidden

## ATmega88P-20P
designator *  value ATmega88P-20P
ki_keywords: AVR 8bit Microcontroller MegaAVR; ki_description: 20MHz, 8kB Flash, 1kB SRAM, 512B EEPROM, DIP-28; ki_fp_filters: DIP*W7.62mm*; Footprint: Package_DIP:DIP-28_W7.62mm; Supplier: http://ww1.microchip.com/downloads/en/DeviceDoc/Atmel-8025-8-bit-AVR-Microcontroller-ATmega48P-88P-168P_Datasheet.pdf
footprint DIP-28_W7.62mm
pins: 1 ~{{RESET}/PC6} (io), 2 PD0 (io), 3 PD1 (io), 4 PD2 (io), 5 PD3 (io), 6 PD4 (io), 7 VCC (power), 8 GND (power), 9 XTAL1/PB6 (io), 10 XTAL2/PB7 (io), 11 PD5 (io), 12 PD6 (io), 13 PD7 (io), 14 PB0 (io), 15 PB1 (io), 16 PB2 (io), 17 PB3 (io), 18 PB4 (io), 19 PB5 (io), 20 AVCC (power), 21 AREF, 22 GND hidden, 23 PC0 (io), 24 PC1 (io), 25 PC2 (io), 26 PC3 (io), 27 PC4 (io), 28 PC5 (io)

## ATmega88PA-A
designator *  value ATmega88PA-A
ki_keywords: AVR 8bit Microcontroller MegaAVR PicoPower; ki_description: 20MHz, 8kB Flash, 1kB SRAM, 512B EEPROM, TQFP-32; ki_fp_filters: TQFP*7x7mm*P0.8mm*; Footprint: Package_QFP:TQFP-32_7x7mm_P0.8mm; Supplier: http://ww1.microchip.com/downloads/en/DeviceDoc/ATmega48PA_88PA_168PA-Data-Sheet-40002011A.pdf
footprint TQFP-32_7x7mm_P0.8mm
pins: 1 PD3 (io), 2 PD4 (io), 3 GND (power), 4 VCC (power), 5 GND hidden, 6 VCC hidden, 7 XTAL1/PB6 (io), 8 XTAL2/PB7 (io), 9 PD5 (io), 10 PD6 (io), 11 PD7 (io), 12 PB0 (io), 13 PB1 (io), 14 PB2 (io), 15 PB3 (io), 16 PB4 (io), 17 PB5 (io), 18 AVCC (power), 19 ADC6 (in), 20 AREF, 21 GND hidden, 22 ADC7 (in), 23 PC0 (io), 24 PC1 (io), 25 PC2 (io), 26 PC3 (io), 27 PC4 (io), 28 PC5 (io), 29 ~{{RESET}/PC6} (io), 30 PD0 (io), 31 PD1 (io), 32 PD2 (io)

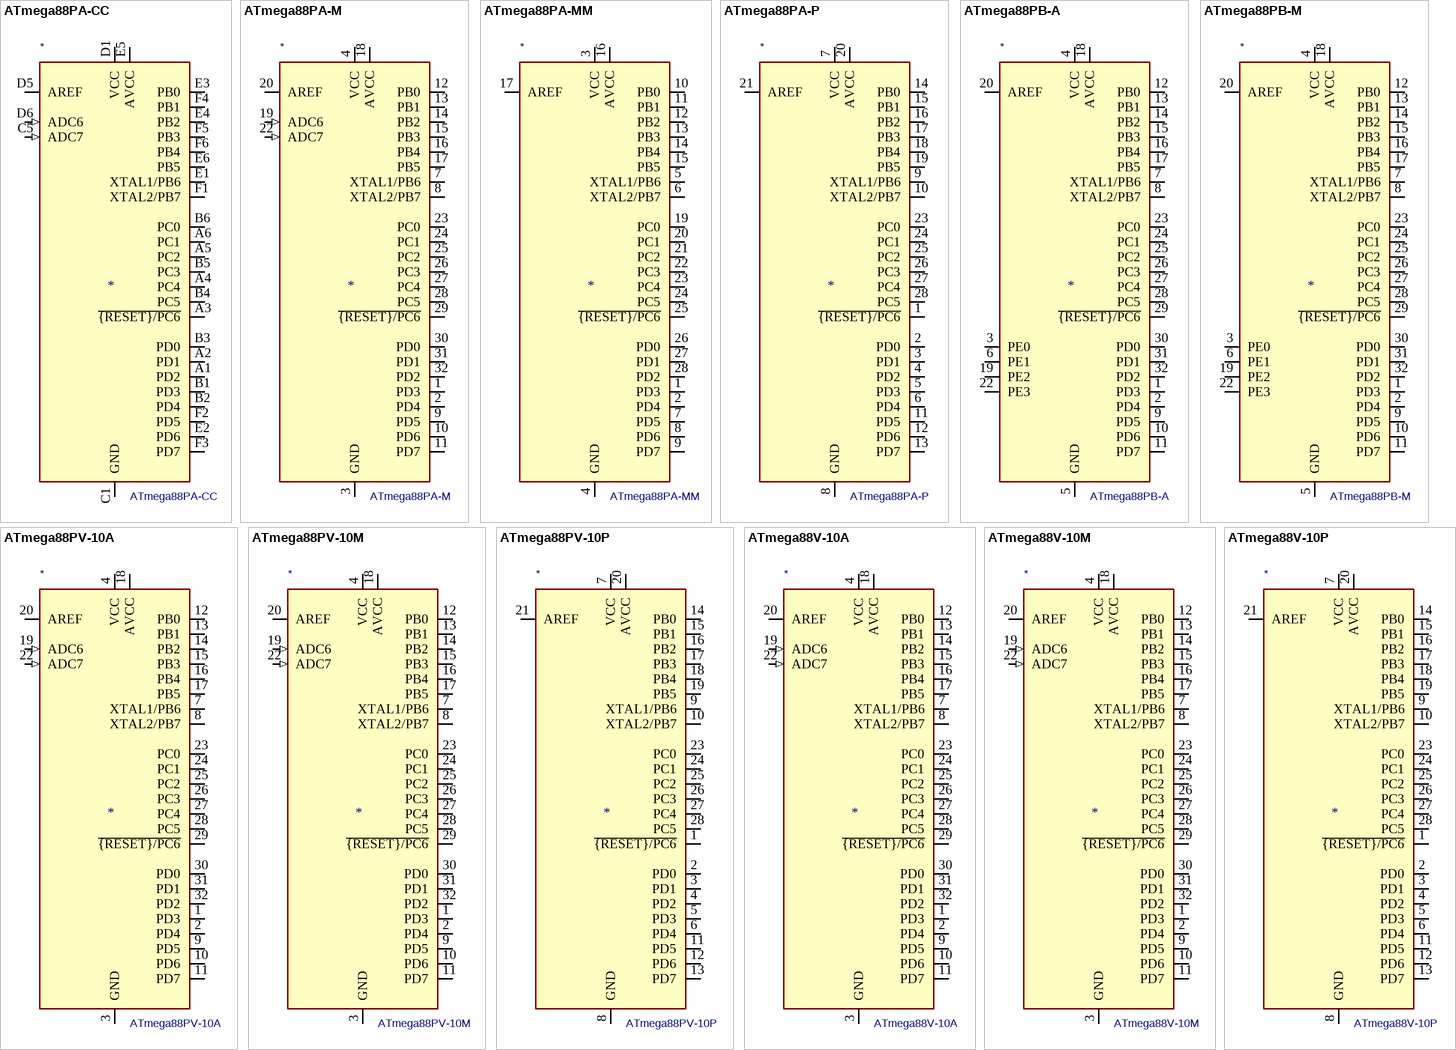
[diagram p7: symbols ATmega88PA-CC to ATmega88V-10P]

## ATmega88PA-CC
designator *  value ATmega88PA-CC
ki_keywords: AVR 8bit Microcontroller MegaAVR PicoPower; ki_description: 20MHz, 8kB Flash, 1kB SRAM, 512B EEPROM, UFBGA-32; ki_fp_filters: UFBGA*4.0x4.0mm*Layout6x6*P0.5mm*; Footprint: Package_BGA:UFBGA-32_4.0x4.0mm_Layout6x6_P0.5mm; Supplier: http://ww1.microchip.com/downloads/en/DeviceDoc/ATmega48PA_88PA_168PA-Data-Sheet-40002011A.pdf
footprint UFBGA-32_4.0x4.0mm_Layout6x6_P0.5mm
pins: A1 PD2 (io), A2 PD1 (io), A3 ~{{RESET}/PC6} (io), A4 PC4 (io), A5 PC2 (io), A6 PC1 (io), B1 PD3 (io), B2 PD4 (io), B3 PD0 (io), B4 PC5 (io), B5 PC3 (io), B6 PC0 (io), C1 GND (power), C2 GND hidden, C5 ADC7 (in), C6 GND hidden, D1 VCC (power), D2 VCC hidden, D5 AREF, D6 ADC6 (in), E1 XTAL1/PB6 (io), E2 PD6 (io), E3 PB0 (io), E4 PB2 (io), E5 AVCC (power), E6 PB5 (io), F1 XTAL2/PB7 (io), F2 PD5 (io), F3 PD7 (io), F4 PB1 (io), F5 PB3 (io), F6 PB4 (io)

## ATmega88PA-M
designator *  value ATmega88PA-M
ki_keywords: AVR 8bit Microcontroller MegaAVR PicoPower; ki_description: 20MHz, 8kB Flash, 1kB SRAM, 512B EEPROM, QFN-32; ki_fp_filters: QFN*1EP*5x5mm*P0.5mm*; Footprint: Package_DFN_QFN:QFN-32-1EP_5x5mm_P0.5mm_EP3.1x3.1mm; Supplier: http://ww1.microchip.com/downloads/en/DeviceDoc/ATmega48PA_88PA_168PA-Data-Sheet-40002011A.pdf
footprint QFN-32-1EP_5x5mm_P0.5mm_EP3.1x3.1mm
pins: 1 PD3 (io), 2 PD4 (io), 3 GND (power), 4 VCC (power), 5 GND hidden, 6 VCC hidden, 7 XTAL1/PB6 (io), 8 XTAL2/PB7 (io), 9 PD5 (io), 10 PD6 (io), 11 PD7 (io), 12 PB0 (io), 13 PB1 (io), 14 PB2 (io), 15 PB3 (io), 16 PB4 (io), 17 PB5 (io), 18 AVCC (power), 19 ADC6 (in), 20 AREF, 21 GND hidden, 22 ADC7 (in), 23 PC0 (io), 24 PC1 (io), 25 PC2 (io), 26 PC3 (io), 27 PC4 (io), 28 PC5 (io), 29 ~{{RESET}/PC6} (io), 30 PD0 (io), 31 PD1 (io), 32 PD2 (io), 33 GND hidden

## ATmega88PA-MM
designator *  value ATmega88PA-MM
ki_keywords: AVR 8bit Microcontroller MegaAVR PicoPower; ki_description: 20MHz, 8kB Flash, 1kB SRAM, 512B EEPROM, QFN-28; ki_fp_filters: QFN*1EP*4x4mm*P0.45mm*; Footprint: Package_DFN_QFN:QFN-28-1EP_4x4mm_P0.45mm_EP2.4x2.4mm; Supplier: http://ww1.microchip.com/downloads/en/DeviceDoc/ATmega48PA_88PA_168PA-Data-Sheet-40002011A.pdf
footprint QFN-28-1EP_4x4mm_P0.45mm_EP2.4x2.4mm
pins: 1 PD3 (io), 2 PD4 (io), 3 VCC (power), 4 GND (power), 5 XTAL1/PB6 (io), 6 XTAL2/PB7 (io), 7 PD5 (io), 8 PD6 (io), 9 PD7 (io), 10 PB0 (io), 11 PB1 (io), 12 PB2 (io), 13 PB3 (io), 14 PB4 (io), 15 PB5 (io), 16 AVCC (power), 17 AREF, 18 GND hidden, 19 PC0 (io), 20 PC1 (io), 21 PC2 (io), 22 PC3 (io), 23 PC4 (io), 24 PC5 (io), 25 ~{{RESET}/PC6} (io), 26 PD0 (io), 27 PD1 (io), 28 PD2 (io), 29 GND hidden

## ATmega88PA-P
designator *  value ATmega88PA-P
ki_keywords: AVR 8bit Microcontroller MegaAVR PicoPower; ki_description: 20MHz, 8kB Flash, 1kB SRAM, 512B EEPROM, DIP-28; ki_fp_filters: DIP*W7.62mm*; Footprint: Package_DIP:DIP-28_W7.62mm; Supplier: http://ww1.microchip.com/downloads/en/DeviceDoc/ATmega48PA_88PA_168PA-Data-Sheet-40002011A.pdf
footprint DIP-28_W7.62mm
pins: 1 ~{{RESET}/PC6} (io), 2 PD0 (io), 3 PD1 (io), 4 PD2 (io), 5 PD3 (io), 6 PD4 (io), 7 VCC (power), 8 GND (power), 9 XTAL1/PB6 (io), 10 XTAL2/PB7 (io), 11 PD5 (io), 12 PD6 (io), 13 PD7 (io), 14 PB0 (io), 15 PB1 (io), 16 PB2 (io), 17 PB3 (io), 18 PB4 (io), 19 PB5 (io), 20 AVCC (power), 21 AREF, 22 GND hidden, 23 PC0 (io), 24 PC1 (io), 25 PC2 (io), 26 PC3 (io), 27 PC4 (io), 28 PC5 (io)

## ATmega88PB-A
designator *  value ATmega88PB-A
ki_keywords: AVR 8bit Microcontroller MegaAVR; ki_description: 20MHz, 8kB Flash, 1kB SRAM, 512B EEPROM, TQFP-32; ki_fp_filters: TQFP*7x7mm*P0.8mm*; Footprint: Package_QFP:TQFP-32_7x7mm_P0.8mm; Supplier: http://ww1.microchip.com/downloads/en/DeviceDoc/40001909A.pdf
footprint TQFP-32_7x7mm_P0.8mm
pins: 1 PD3 (io), 2 PD4 (io), 3 PE0 (io), 4 VCC (power), 5 GND (power), 6 PE1 (io), 7 XTAL1/PB6 (io), 8 XTAL2/PB7 (io), 9 PD5 (io), 10 PD6 (io), 11 PD7 (io), 12 PB0 (io), 13 PB1 (io), 14 PB2 (io), 15 PB3 (io), 16 PB4 (io), 17 PB5 (io), 18 AVCC (power), 19 PE2 (io), 20 AREF, 21 GND hidden, 22 PE3 (io), 23 PC0 (io), 24 PC1 (io), 25 PC2 (io), 26 PC3 (io), 27 PC4 (io), 28 PC5 (io), 29 ~{{RESET}/PC6} (io), 30 PD0 (io), 31 PD1 (io), 32 PD2 (io)

## ATmega88PB-M
designator *  value ATmega88PB-M
ki_keywords: AVR 8bit Microcontroller MegaAVR; ki_description: 20MHz, 8kB Flash, 1kB SRAM, 512B EEPROM, QFN-32; ki_fp_filters: QFN*1EP*5x5mm*P0.5mm*; Footprint: Package_DFN_QFN:QFN-32-1EP_5x5mm_P0.5mm_EP3.1x3.1mm; Supplier: http://ww1.microchip.com/downloads/en/DeviceDoc/40001909A.pdf
footprint QFN-32-1EP_5x5mm_P0.5mm_EP3.1x3.1mm
pins: 1 PD3 (io), 2 PD4 (io), 3 PE0 (io), 4 VCC (power), 5 GND (power), 6 PE1 (io), 7 XTAL1/PB6 (io), 8 XTAL2/PB7 (io), 9 PD5 (io), 10 PD6 (io), 11 PD7 (io), 12 PB0 (io), 13 PB1 (io), 14 PB2 (io), 15 PB3 (io), 16 PB4 (io), 17 PB5 (io), 18 AVCC (power), 19 PE2 (io), 20 AREF, 21 GND hidden, 22 PE3 (io), 23 PC0 (io), 24 PC1 (io), 25 PC2 (io), 26 PC3 (io), 27 PC4 (io), 28 PC5 (io), 29 ~{{RESET}/PC6} (io), 30 PD0 (io), 31 PD1 (io), 32 PD2 (io), 33 GND hidden

## ATmega88PV-10A
designator *  value ATmega88PV-10A
ki_keywords: AVR 8bit Microcontroller MegaAVR; ki_description: 10MHz, 8kB Flash, 1kB SRAM, 512B EEPROM, TQFP-32; ki_fp_filters: TQFP*7x7mm*P0.8mm*; Footprint: Package_QFP:TQFP-32_7x7mm_P0.8mm; Supplier: http://ww1.microchip.com/downloads/en/DeviceDoc/Atmel-8025-8-bit-AVR-Microcontroller-ATmega48P-88P-168P_Datasheet.pdf
footprint TQFP-32_7x7mm_P0.8mm
pins: 1 PD3 (io), 2 PD4 (io), 3 GND (power), 4 VCC (power), 5 GND hidden, 6 VCC hidden, 7 XTAL1/PB6 (io), 8 XTAL2/PB7 (io), 9 PD5 (io), 10 PD6 (io), 11 PD7 (io), 12 PB0 (io), 13 PB1 (io), 14 PB2 (io), 15 PB3 (io), 16 PB4 (io), 17 PB5 (io), 18 AVCC (power), 19 ADC6 (in), 20 AREF, 21 GND hidden, 22 ADC7 (in), 23 PC0 (io), 24 PC1 (io), 25 PC2 (io), 26 PC3 (io), 27 PC4 (io), 28 PC5 (io), 29 ~{{RESET}/PC6} (io), 30 PD0 (io), 31 PD1 (io), 32 PD2 (io)

## ATmega88PV-10M
designator *  value ATmega88PV-10M
ki_keywords: AVR 8bit Microcontroller MegaAVR; ki_description: 10MHz, 8kB Flash, 1kB SRAM, 512B EEPROM, QFN-32; ki_fp_filters: QFN*1EP*5x5mm*P0.5mm*; Footprint: Package_DFN_QFN:QFN-32-1EP_5x5mm_P0.5mm_EP3.1x3.1mm; Supplier: http://ww1.microchip.com/downloads/en/DeviceDoc/Atmel-8025-8-bit-AVR-Microcontroller-ATmega48P-88P-168P_Datasheet.pdf
footprint QFN-32-1EP_5x5mm_P0.5mm_EP3.1x3.1mm
pins: 1 PD3 (io), 2 PD4 (io), 3 GND (power), 4 VCC (power), 5 GND hidden, 6 VCC hidden, 7 XTAL1/PB6 (io), 8 XTAL2/PB7 (io), 9 PD5 (io), 10 PD6 (io), 11 PD7 (io), 12 PB0 (io), 13 PB1 (io), 14 PB2 (io), 15 PB3 (io), 16 PB4 (io), 17 PB5 (io), 18 AVCC (power), 19 ADC6 (in), 20 AREF, 21 GND hidden, 22 ADC7 (in), 23 PC0 (io), 24 PC1 (io), 25 PC2 (io), 26 PC3 (io), 27 PC4 (io), 28 PC5 (io), 29 ~{{RESET}/PC6} (io), 30 PD0 (io), 31 PD1 (io), 32 PD2 (io), 33 GND hidden